# Altium schematic symbol library 13-Analog D 数模模数.SchLib: 573 symbols (part 6 of 6)
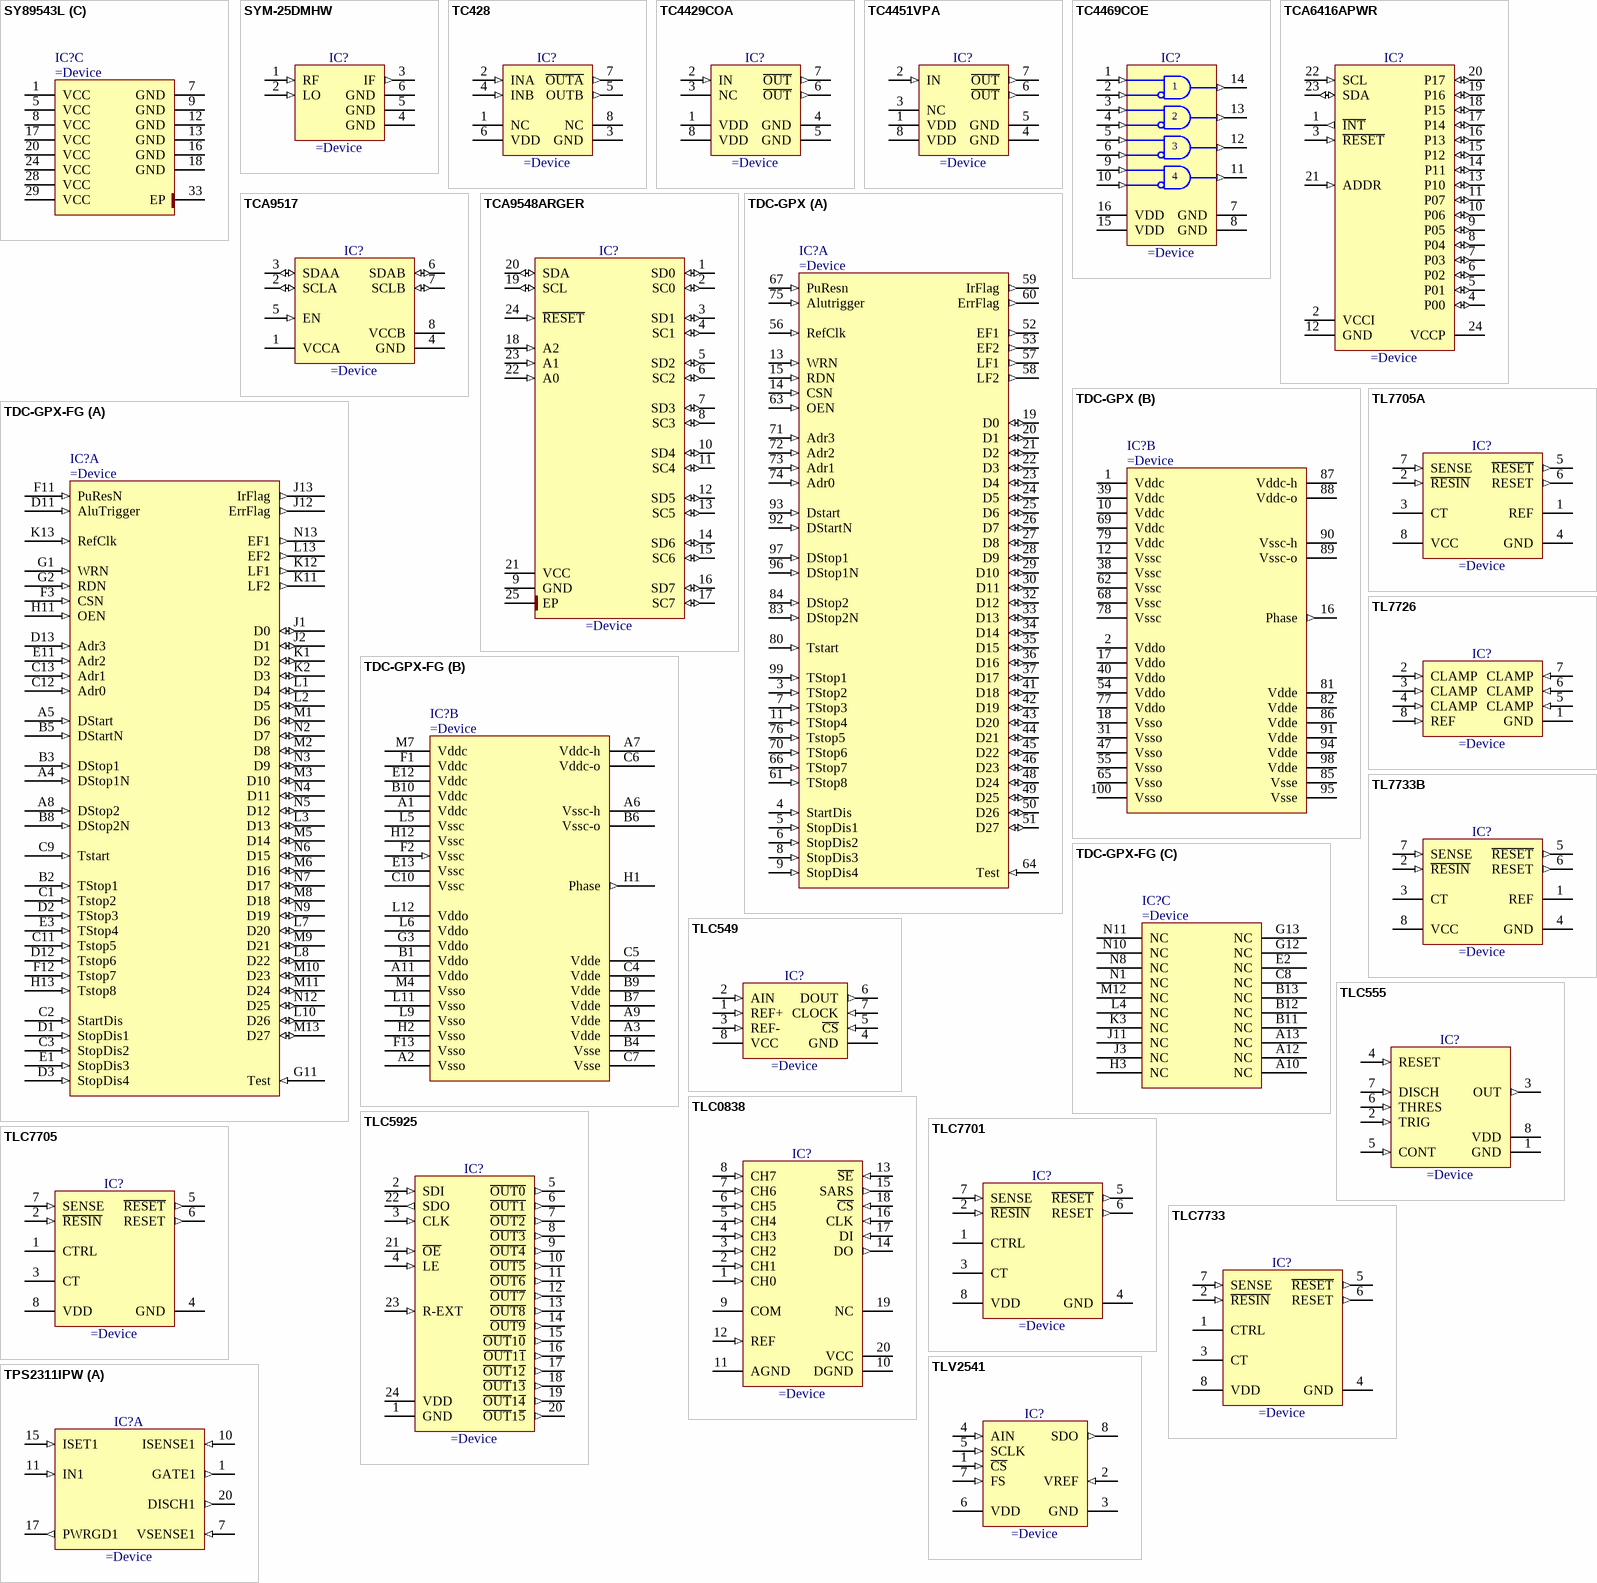
[diagram p45: symbols SY89543L to TPS2311IPW]

## TC4469COE
designator IC?
Logic-Input CMOS Quad Drivers
pins: 1 1A (in), 2 1B (in), 3 2A (in), 4 2B (in), 5 3A (in), 6 3B (in), 7 GND (power), 8 GND (power), 9 4A (in), 10 4B (in), 11 4Y (out), 12 3Y (out), 13 2Y (out), 14 1Y (out), 15 VDD (power), 16 VDD (power)

## TCA6416APWR
designator IC?
Low-Voltage 16-Bit I2C and SMBus I/O Expander
pins: 1 ~{INT} (out), 2 VCCI (power), 3 ~{RESET} (in), 4 P00 (io), 5 P01 (io), 6 P02 (io), 7 P03 (io), 8 P04 (io), 9 P05 (io), 10 P06 (io), 11 P07 (io), 12 GND (power), 13 P10 (io), 14 P11 (io), 15 P12 (io), 16 P13 (io), 17 P14 (io), 18 P15 (io), 19 P16 (io), 20 P17 (io), 21 ADDR (in), 22 SCL (in), 23 SDA (io), 24 VCCP (power)

## TCA9517
designator IC?
Level-Translating I2C Bus Repeater
pins: 1 VCCA (power) "I2C-bus SCL", 2 SCLA (io) "Transmit Signal", 3 SDAA (io) "Negative Supply", 4 GND (power) "I2C-bus SDA", 5 EN (in) "Positive Supply Voltage", 6 SDAB (io) "Transmit Signal", 7 SCLB (io) "Receive Signal", 8 VCCB (power) "Receive Signal"

## TCA9548ARGER
designator IC?
Low Voltage 8-Channel I2C Switch With Reset
pins: 1 SD0 (io), 2 SC0 (io), 3 SD1 (io), 4 SC1 (io), 5 SD2 (io), 6 SC2 (io), 7 SD3 (io), 8 SC3 (io), 9 GND (power), 10 SD4 (io), 11 SC4 (io), 12 SD5 (io), 13 SC5 (io), 14 SD6 (io), 15 SC6 (io), 16 SD7 (io), 17 SC7 (io), 18 A2 (in), 19 SCL (io), 20 SDA (io), 21 VCC (power), 22 A0 (in), 23 A1 (in), 24 ~{RESET} (in), 25 EP (power)

## TDC-GPX
designator IC?
Multifunctional High-End Time-to-Digital Converter (4 different operation modes, 81 ps up to 10 ps resolution)
part A pins: 3 TStop2 (in), 4 StartDis (in), 5 StopDis1 (in), 6 StopDis2 (in), 7 TStop3 (in), 8 StopDis3 (in), 9 StopDis4 (in), 11 TStop4 (in), 13 WRN (in), 14 CSN (in), 15 RDN (in), 19 D0 (io), 20 D1 (io), 21 D2 (io), 22 D3 (io), 23 D4 (io), 24 D5 (io), 25 D6 (io), 26 D7 (io), 27 D8 (io), 28 D9 (io), 29 D10 (io), 30 D11 (io), 32 D12 (io), 33 D13 (io), 34 D14 (io), 35 D15 (io), 36 D16 (io), 37 D17 (io), 41 D18 (io), 42 D19 (io), 43 D20 (io), 44 D21 (io), 45 D22 (io), 46 D23 (io), 48 D24 (io), 49 D25 (io), 50 D26 (io), 51 D27 (io), 52 EF1 (out), 53 EF2 (out), 56 RefClk (in), 57 LF1 (out), 58 LF2 (out), 59 IrFlag (out), 60 ErrFlag (out), 61 TStop8 (in), 63 OEN (in), 64 Test (in), 66 TStop7 (in), 67 PuResn (in), 70 TStop6 (in), 71 Adr3 (in), 72 Adr2 (in), 73 Adr1 (in), 74 Adr0 (in), 75 Alutrigger (in), 76 Tstop5 (in), 80 Tstart (in), 83 DStop2N (in), 84 DStop2 (in), 92 DStartN (in), 93 Dstart (in), 96 DStop1N (in), 97 DStop1 (in), 99 TStop1 (in)
part B pins: 1 Vddc (power), 2 Vddo (power), 10 Vddc (power), 12 Vssc (power), 16 Phase (out), 17 Vddo (power), 18 Vsso (power), 31 Vsso (power), 38 Vssc (power), 39 Vddc (power), 40 Vddo (power), 47 Vsso (power), 54 Vddo (power), 55 Vsso (power), 62 Vssc (power), 65 Vsso (power), 68 Vssc (power), 69 Vddc (power), 77 Vddo (power), 78 Vssc (power), 79 Vddc (power), 81 Vdde (power), 82 Vdde (power), 85 Vsse (power), 86 Vdde (power), 87 Vddc-h (power), 88 Vddc-o (power), 89 Vssc-o (power), 90 Vssc-h (power), 91 Vdde (power), 94 Vdde (power), 95 Vsse (power), 98 Vdde (power), 100 Vsso (power)

## TDC-GPX-FG
designator IC?
Multifunctional High-End Time-to-Digital Converter (4 different operation modes, 81 ps up to 10 ps resolution)
part A pins: A4 DStop1N (in), A5 DStart (in), A8 DStop2 (in), B2 TStop1 (in), B3 DStop1 (in), B5 DStartN (in), B8 DStop2N (in), C1 Tstop2 (in), C2 StartDis (in), C3 StopDis2 (in), C9 Tstart (in), C11 Tstop5 (in), C12 Adr0 (in), C13 Adr1 (in), D1 StopDis1 (in), D2 TStop3 (in), D3 StopDis4 (in), D11 AluTrigger (in), D12 Tstop6 (in), D13 Adr3 (in), E1 StopDis3 (in), E3 TStop4 (in), E11 Adr2 (in), F3 CSN (in), F11 PuResN (in), F12 Tstop7 (in), G1 WRN (in), G2 RDN (in), G11 Test (in), H11 OEN (in), H13 Tstop8 (in), J1 D0 (io), J2 D1 (io), J12 ErrFlag (out), J13 IrFlag (out), K1 D2 (io), K2 D3 (io), K11 LF2 (out), K12 LF1 (out), K13 RefClk (in), L1 D4 (io), L2 D5 (io), L3 D13 (io), L7 D20 (io), L8 D22 (io), L10 D26 (io), L13 EF2 (out), M1 D6 (io), M2 D8 (io), M3 D10 (io), M5 D14 (io), M6 D16 (io), M8 D18 (io), M9 D21 (io), M10 D23 (io), M11 D24 (io), M13 D27 (io), N2 D7 (io), N3 D9 (io), N4 D11 (io), N5 D12 (io), N6 D15 (io), N7 D17 (io), N9 D19 (io), N12 D25 (io), N13 EF1 (out)
part B pins: A1 Vddc (power), A2 Vsso (power), A3 Vdde (power), A6 Vssc-h (power), A7 Vddc-h (power), A9 Vdde (power), A11 Vddo (power), B1 Vddo (power), B4 Vsse (power), B6 Vssc-o (power), B7 Vdde (power), B9 Vdde (power), B10 Vddc (power), C4 Vdde (power), C5 Vdde (power), C6 Vddc-o (power), C7 Vsse (power), C10 Vssc (power), E12 Vddc (power), E13 Vssc (power), F1 Vddc (power), F2 Vssc (in), F13 Vsso (power), G3 Vddo (power), H1 Phase (out), H2 Vsso (power), H12 Vssc (power), L5 Vssc (power), L6 Vddo (power), L9 Vsso (power), L11 Vsso (power), L12 Vddo (power), M4 Vsso (power), M7 Vddc (power)
part C pins: A10 NC, A12 NC, A13 NC, B11 NC, B12 NC, B13 NC, C8 NC, E2 NC, G12 NC, G13 NC, H3 NC, J3 NC, J11 NC, K3 NC, L4 NC, M12 NC, N1 NC, N8 NC, N10 NC, N11 NC

## TL7705A
designator IC?
Single Supply Voltage Supervisor for 5V Systems with Programmable Time Delay
pins: 1 REF, 2 ~{RESIN} (in), 3 CT, 4 GND (power), 5 ~{RESET} (out), 6 RESET (out), 7 SENSE (in), 8 VCC (power)

## TL7726
designator IC?
Hex Clamping Circuit
pins: 1 GND (power), 2 CLAMP (in), 3 CLAMP (in), 4 CLAMP (in), 5 CLAMP (in), 6 CLAMP (in), 7 CLAMP (in), 8 REF (in)

## TL7733B
designator IC?
3V Supply Voltage Supervisor
pins: 1 REF, 2 ~{RESIN} (in), 3 CT, 4 GND (power), 5 ~{RESET} (out), 6 RESET (out), 7 SENSE (in), 8 VCC (power)

## TLC549
designator IC?
8-Bit Analog-To-Digital Converter With Serial Control
pins: 1 REF+ (in), 2 AIN (in), 3 REF- (in), 4 GND (power), 5 ~{CS} (in), 6 DOUT (out), 7 CLOCK (in), 8 VCC (power)

## TLC555
designator IC?
LinCMOS Timer
pins: 1 GND (power), 2 TRIG (in), 3 OUT (out), 4 RESET (in), 5 CONT (in), 6 THRES (in), 7 DISCH (in), 8 VDD (power)

## TLC0838
designator IC?
8-Bit Analog-to-Digital Converter With Serial Control
pins: 1 CH0 (in), 2 CH1 (in), 3 CH2 (in), 4 CH3 (in), 5 CH4 (in), 6 CH5 (in), 7 CH6 (in), 8 CH7 (in), 9 COM (power), 10 DGND (power), 11 AGND (power), 12 REF (in), 13 ~{SE} (in), 14 DO (out), 15 SARS (out), 16 CLK (in), 17 DI (in), 18 ~{CS} (in), 19 NC, 20 VCC (power)

## TLC5925
designator IC?
Low-Power 16-Channel Constant-Current LED Sink Driver
pins: 1 GND (power), 2 SDI (in), 3 CLK (in), 4 LE (in), 5 ~{OUT0} (out), 6 ~{OUT1} (out), 7 ~{OUT2} (out), 8 ~{OUT3} (out), 9 ~{OUT4} (out), 10 ~{OUT5} (out), 11 ~{OUT6} (out), 12 ~{OUT7} (out), 13 ~{OUT8} (out), 14 ~{OUT9} (out), 15 ~{OUT}1~{0} (out), 16 ~{OUT}1~{1} (out), 17 ~{OUT}1~{2} (out), 18 ~{OUT}1~{3} (out), 19 ~{OUT}1~{4} (out), 20 ~{OUT}1~{5} (out), 21 ~{OE} (in), 22 SDO (out), 23 R-EXT (in), 24 VDD (power)

## TLC7701
designator IC?
1.1V Supply Voltage Supervisors With Programmable Time Delay
pins: 1 CTRL, 2 ~{RESIN} (in), 3 CT, 4 GND (power), 5 ~{RESET} (out), 6 RESET (out), 7 SENSE (in), 8 VDD (power)

## TLC7705
designator IC?
Micropower 5V Supply Voltage Supervisors With Programmable Time Delay & Push-Pull Outputs
pins: 1 CTRL, 2 ~{RESIN} (in), 3 CT, 4 GND (power), 5 ~{RESET} (out), 6 RESET (out), 7 SENSE (in), 8 VDD (power)

## TLC7733
designator IC?
2.93V Supply Voltage Supervisors With Programmable Time Delay
pins: 1 CTRL, 2 ~{RESIN} (in), 3 CT, 4 GND (power), 5 ~{RESET} (out), 6 RESET (out), 7 SENSE (in), 8 VDD (power)

## TLV2541
designator IC?
2.7V To 5.5V, Low-Power, 12-BIT, 200 kSPS, Serial DAC With Auto Power Down
pins: 1 ~{CS} (in), 2 VREF (in), 3 GND (power), 4 AIN (in), 5 SCLK (in), 6 VDD (power), 7 FS (in), 8 SDO (out)

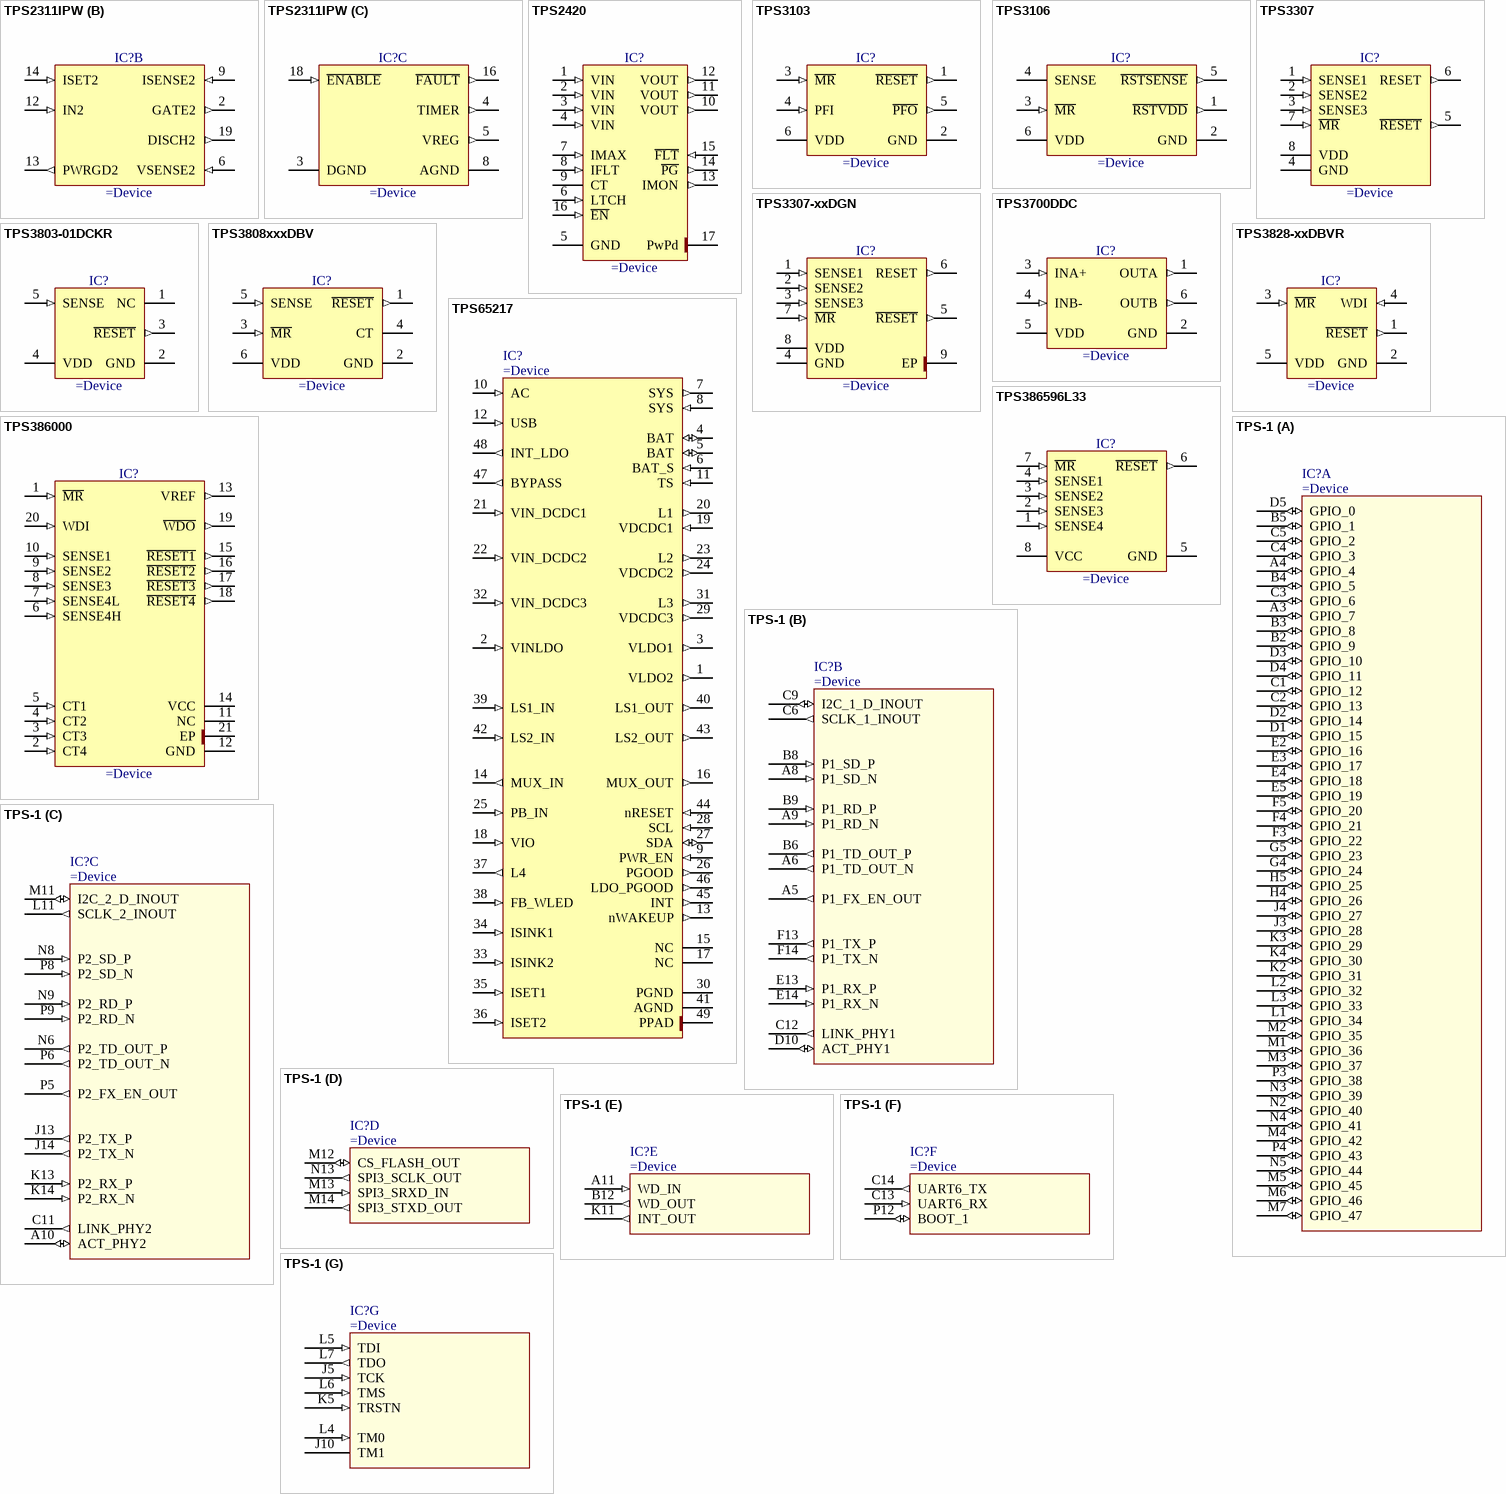
[diagram p36: symbols TPS2311IPW to TPS-1]

## TPS2311IPW
designator IC?
Dual Hot-Swao Power Controller With Interdependent Circuit Breaker and Power-Good Reporting
part A pins: 1 GATE1 (out), 7 VSENSE1 (in), 10 ISENSE1 (in), 11 IN1 (in), 15 ISET1 (in), 17 PWRGD1 (out), 20 DISCH1 (out)
part B pins: 2 GATE2 (out), 6 VSENSE2 (in), 9 ISENSE2 (in), 12 IN2 (in), 13 PWRGD2 (out), 14 ISET2 (in), 19 DISCH2 (out)
part C pins: 3 DGND (power), 4 TIMER (out), 5 VREG (out), 8 AGND (power), 16 ~{FAULT} (out), 18 ~{ENABLE} (in)

## TPS2420
designator IC?
3 V to 20 V, Integrated FET Hot Swao Controller
pins: 1 VIN (in), 2 VIN (in), 3 VIN (in), 4 VIN (in), 5 GND (power), 6 LTCH (in), 7 IMAX (in), 8 IFLT (in), 9 CT, 10 VOUT (out), 11 VOUT (out), 12 VOUT (out), 13 IMON (out), 14 ~{PG} (out), 15 ~{FLT} (in), 16 ~{EN} (in), 17 PwPd (power)

## TPS3103
designator IC?
UltraLow Supply-Current/Supply-Voltage Supervisory Circuits
pins: 1 ~{RESET} (out), 2 GND (power), 3 ~{MR} (in), 4 PFI (in), 5 ~{PFO} (out), 6 VDD (power)

## TPS3106
designator IC?
UltraLow Supply-Current/Supply-Voltage Supervisory Circuits
pins: 1 ~{RSTVDD} (out), 2 GND (power), 3 ~{MR} (in), 4 SENSE, 5 ~{RSTSENSE} (out), 6 VDD (power)

## TPS3307
designator IC?
Triple Processor Supervisors
pins: 1 SENSE1 (in), 2 SENSE2 (in), 3 SENSE3 (in), 4 GND (power), 5 ~{RESET} (out), 6 RESET (out), 7 ~{MR} (in), 8 VDD (power)

## TPS3307-xxDGN
designator IC?
Triple Processor Supervisors
pins: 1 SENSE1 (in), 2 SENSE2 (in), 3 SENSE3 (in), 4 GND (power), 5 ~{RESET} (out), 6 RESET (out), 7 ~{MR} (in), 8 VDD (power), 9 EP (power)

## TPS3700DDC
designator IC?
Window Comparator for Over- and Undervoltage Detection
pins: 1 OUTA (out), 2 GND (power), 3 INA+ (in), 4 INB- (in), 5 VDD (power), 6 OUTB (out)

## TPS3803-01DCKR
designator IC?
Single Voltage Detector
pins: 1 NC, 2 GND (power), 3 ~{RESET} (out), 4 VDD (power), 5 SENSE (in)

## TPS3808xxxDBV
designator IC?
Low Quiescent Current, Programmable-Delay Supervisory Circuit
pins: 1 ~{RESET} (out), 2 GND (power), 3 ~{MR} (in), 4 CT, 5 SENSE (in), 6 VDD (power)

## TPS3828-xxDBVR
designator IC?
Processor Supervisory Circuit
pins: 1 ~{RESET} (out), 2 GND (power), 3 ~{MR} (in), 4 WDI (in), 5 VDD (power)

## TPS65217
designator IC?
Single Chip Power Solution for Battery Powered Systems
pins: 1 VLDO2 (out), 2 VINLDO (in), 3 VLDO1 (out), 4 BAT (io), 5 BAT (io), 6 BAT_S (in), 7 SYS (out), 8 SYS (in), 9 PWR_EN (in), 10 AC (in), 11 TS (in), 12 USB (in), 13 nWAKEUP (out), 14 MUX_IN (out), 15 NC, 16 MUX_OUT (out), 17 NC, 18 VIO (in), 19 VDCDC1 (in), 20 L1 (out), 21 VIN_DCDC1 (in), 22 VIN_DCDC2 (in), 23 L2 (out), 24 VDCDC2 (out), 25 PB_IN (in), 26 PGOOD (out), 27 SDA (io), 28 SCL (in), 29 VDCDC3 (out), 30 PGND (power), 31 L3 (out), 32 VIN_DCDC3 (in), 33 ISINK2 (in), 34 ISINK1 (in), 35 ISET1 (in), 36 ISET2 (in), 37 L4 (out), 38 FB_WLED (in), 39 LS1_IN (in), 40 LS1_OUT (out), 41 AGND (power), 42 LS2_IN (in), 43 LS2_OUT (out), 44 nRESET (in), 45 INT (out), 46 LDO_PGOOD (out), 47 BYPASS (out), 48 INT_LDO (out), 49 PPAD (power)
1 alternate drawing of the same symbol

## TPS386000
designator IC?
Quad Supply Voltage Supervisors with Programmable Delay and Watchdog Timer
pins: 1 ~{MR} (in), 2 CT4 (in), 3 CT3 (in), 4 CT2 (in), 5 CT1 (in), 6 SENSE4H (in), 7 SENSE4L (in), 8 SENSE3 (in), 9 SENSE2 (in), 10 SENSE1 (in), 11 NC, 12 GND (power), 13 VREF (out), 14 VCC (power), 15 ~{RESET1} (out), 16 ~{RESET2} (out), 17 ~{RESET3} (out), 18 ~{RESET4} (out), 19 ~{WDO} (out), 20 WDI (in), 21 EP (power)

## TPS386596L33
designator IC?
Quad Reset Supervisor with Manual Reset Input
pins: 1 SENSE4 (in), 2 SENSE3 (in), 3 SENSE2 (in), 4 SENSE1 (in), 5 GND (power), 6 ~{RESET} (out), 7 ~{MR} (in), 8 VCC (power)

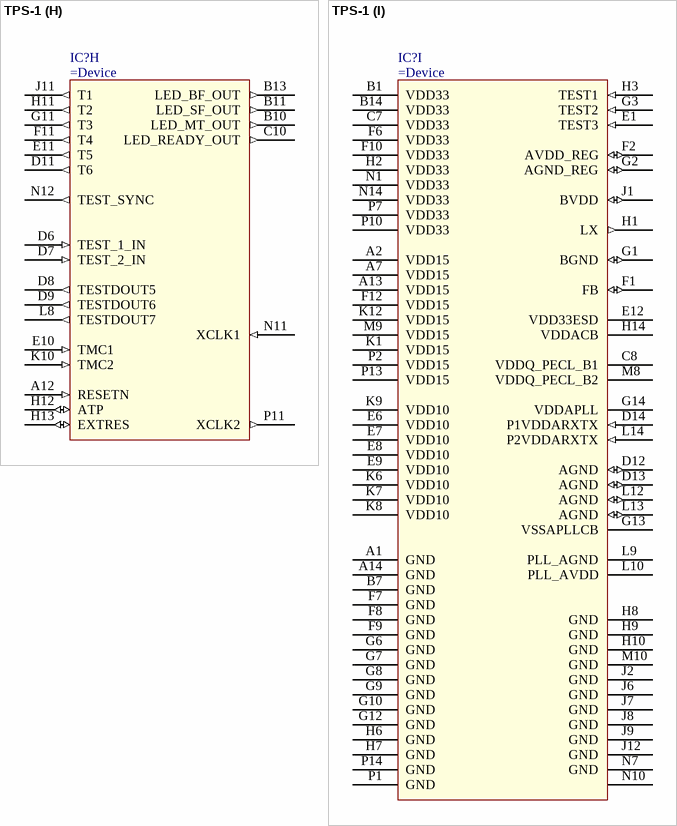
[diagram p37: symbol TPS-1]

## TPS-1
designator IC?
Single Chip Interface Solution for PROFINET IO Devices
part A pins: A3 GPIO_7 (io), A4 GPIO_4 (io), B2 GPIO_9 (io), B3 GPIO_8 (io), B4 GPIO_5 (io), B5 GPIO_1 (io), C1 GPIO_12 (io), C2 GPIO_13 (io), C3 GPIO_6 (io), C4 GPIO_3 (io), C5 GPIO_2 (io), D1 GPIO_15 (io), D2 GPIO_14 (io), D3 GPIO_10 (io), D4 GPIO_11 (io), D5 GPIO_0 (io), E2 GPIO_16 (io), E3 GPIO_17 (io), E4 GPIO_18 (io), E5 GPIO_19 (io), F3 GPIO_22 (io), F4 GPIO_21 (io), F5 GPIO_20 (io), G4 GPIO_24 (io), G5 GPIO_23 (io), H4 GPIO_26 (io), H5 GPIO_25 (io), J3 GPIO_28 (io), J4 GPIO_27 (io), K2 GPIO_31 (io), K3 GPIO_29 (io), K4 GPIO_30 (io), L1 GPIO_34 (io), L2 GPIO_32 (io), L3 GPIO_33 (io), M1 GPIO_36 (io), M2 GPIO_35 (io), M3 GPIO_37 (io), M4 GPIO_42 (io), M5 GPIO_45 (io), M6 GPIO_46 (io), M7 GPIO_47 (io), N2 GPIO_40 (io), N3 GPIO_39 (io), N4 GPIO_41 (io), N5 GPIO_44 (io), P3 GPIO_38 (io), P4 GPIO_43 (io)
part B pins: A5 P1_FX_EN_OUT (out), A6 P1_TD_OUT_N (out), A8 P1_SD_N (in), A9 P1_RD_N (in), B6 P1_TD_OUT_P (out), B8 P1_SD_P (in), B9 P1_RD_P (in), C6 SCLK_1_INOUT (out), C9 I2C_1_D_INOUT (io), C12 LINK_PHY1 (out), D10 ACT_PHY1 (io), E13 P1_RX_P (in), E14 P1_RX_N (in), F13 P1_TX_P (out), F14 P1_TX_N (out)
part C pins: A10 ACT_PHY2 (io), C11 LINK_PHY2 (out), J13 P2_TX_P (out), J14 P2_TX_N (out), K13 P2_RX_P (in), K14 P2_RX_N (in), L11 SCLK_2_INOUT (out), M11 I2C_2_D_INOUT (io), N6 P2_TD_OUT_P (out), N8 P2_SD_P (in), N9 P2_RD_P (in), P5 P2_FX_EN_OUT (out), P6 P2_TD_OUT_N (out), P8 P2_SD_N (in), P9 P2_RD_N (in)
part D pins: M12 CS_FLASH_OUT (io), M13 SPI3_SRXD_IN (in), M14 SPI3_STXD_OUT (out), N13 SPI3_SCLK_OUT (out)
part E pins: A11 WD_IN (in), B12 WD_OUT (out), K11 INT_OUT (out)
part F pins: C13 UART6_RX (in), C14 UART6_TX (out), P12 BOOT_1 (io)
part G pins: J5 TCK (in), J10 TM1 (power), K5 TRSTN (in), L4 TM0 (in), L5 TDI (in), L6 TMS (in), L7 TDO (out)
part H pins: A12 RESETN (in), B10 LED_MT_OUT (out), B11 LED_SF_OUT (out), B13 LED_BF_OUT (out), C10 LED_READY_OUT (out), D6 TEST_1_IN (in), D7 TEST_2_IN (in), D8 TESTDOUT5 (out), D9 TESTDOUT6 (out), D11 T6 (out), E10 TMC1 (in), E11 T5 (out), F11 T4 (out), G11 T3 (out), H11 T2 (out), H12 ATP (io), H13 EXTRES (io), J11 T1 (out), K10 TMC2 (in), L8 TESTDOUT7 (out), N11 XCLK1 (in), N12 TEST_SYNC (out), P11 XCLK2 (out)
part I pins: A1 GND (power), A2 VDD15 (power), A7 VDD15 (power), A13 VDD15 (power), A14 GND (power), B1 VDD33 (power), B7 GND (power), B14 VDD33 (power), C7 VDD33 (power), C8 VDDQ_PECL_B1 (power), D12 AGND (io), D13 AGND (io), D14 P1VDDARXTX (in), E1 TEST3 (in), E6 VDD10 (power), E7 VDD10 (power), E8 VDD10 (power), E9 VDD10 (power), E12 VDD33ESD (power), F1 FB (io), F2 AVDD_REG (io), F6 VDD33 (power), F7 GND (power), F8 GND (power), F9 GND (power), F10 VDD33 (power), F12 VDD15 (power), G1 BGND (io), G2 AGND_REG (io), G3 TEST2 (in), G6 GND (power), G7 GND (power), G8 GND (power), G9 GND (power), G10 GND (power), G12 GND (power), G13 VSSAPLLCB (power), G14 VDDAPLL (power), H1 LX (out), H2 VDD33 (power), H3 TEST1 (in), H6 GND (power), H7 GND (power), H8 GND (power), H9 GND (power), H10 GND (power), H14 VDDACB (power), J1 BVDD (io), J2 GND (power), J6 GND (power), J7 GND (power), J8 GND (power), J9 GND (power), J12 GND (power), K1 VDD15 (power), K6 VDD10 (power), K7 VDD10 (power), K8 VDD10 (power), K9 VDD10 (power), K12 VDD15 (power), L9 PLL_AGND (power), L10 PLL_AVDD (power), L12 AGND (io), L13 AGND (io), L14 P2VDDARXTX (in), M8 VDDQ_PECL_B2 (power), M9 VDD15 (power), M10 GND (power), N1 VDD33 (power), N7 GND (power), N10 GND (power), N14 VDD33 (power), P1 GND (power), P2 VDD15 (power), P7 VDD33 (power), P10 VDD33 (power), P13 VDD15 (power), P14 GND (power)
